# Altium footprint library SMD_Bauteile.PcbLib: 355 footprints (part 17 of 23)
Each footprint in its own frame and in the unit in brackets; x right, y up, seen from the top. Pads: shape width x height; smd on the part's side, far side on the other; paste and mask are expansions set on the pad; w line width, h text height; cw(c..) or ccw(c..) is an arc to the next point about the centre after c.
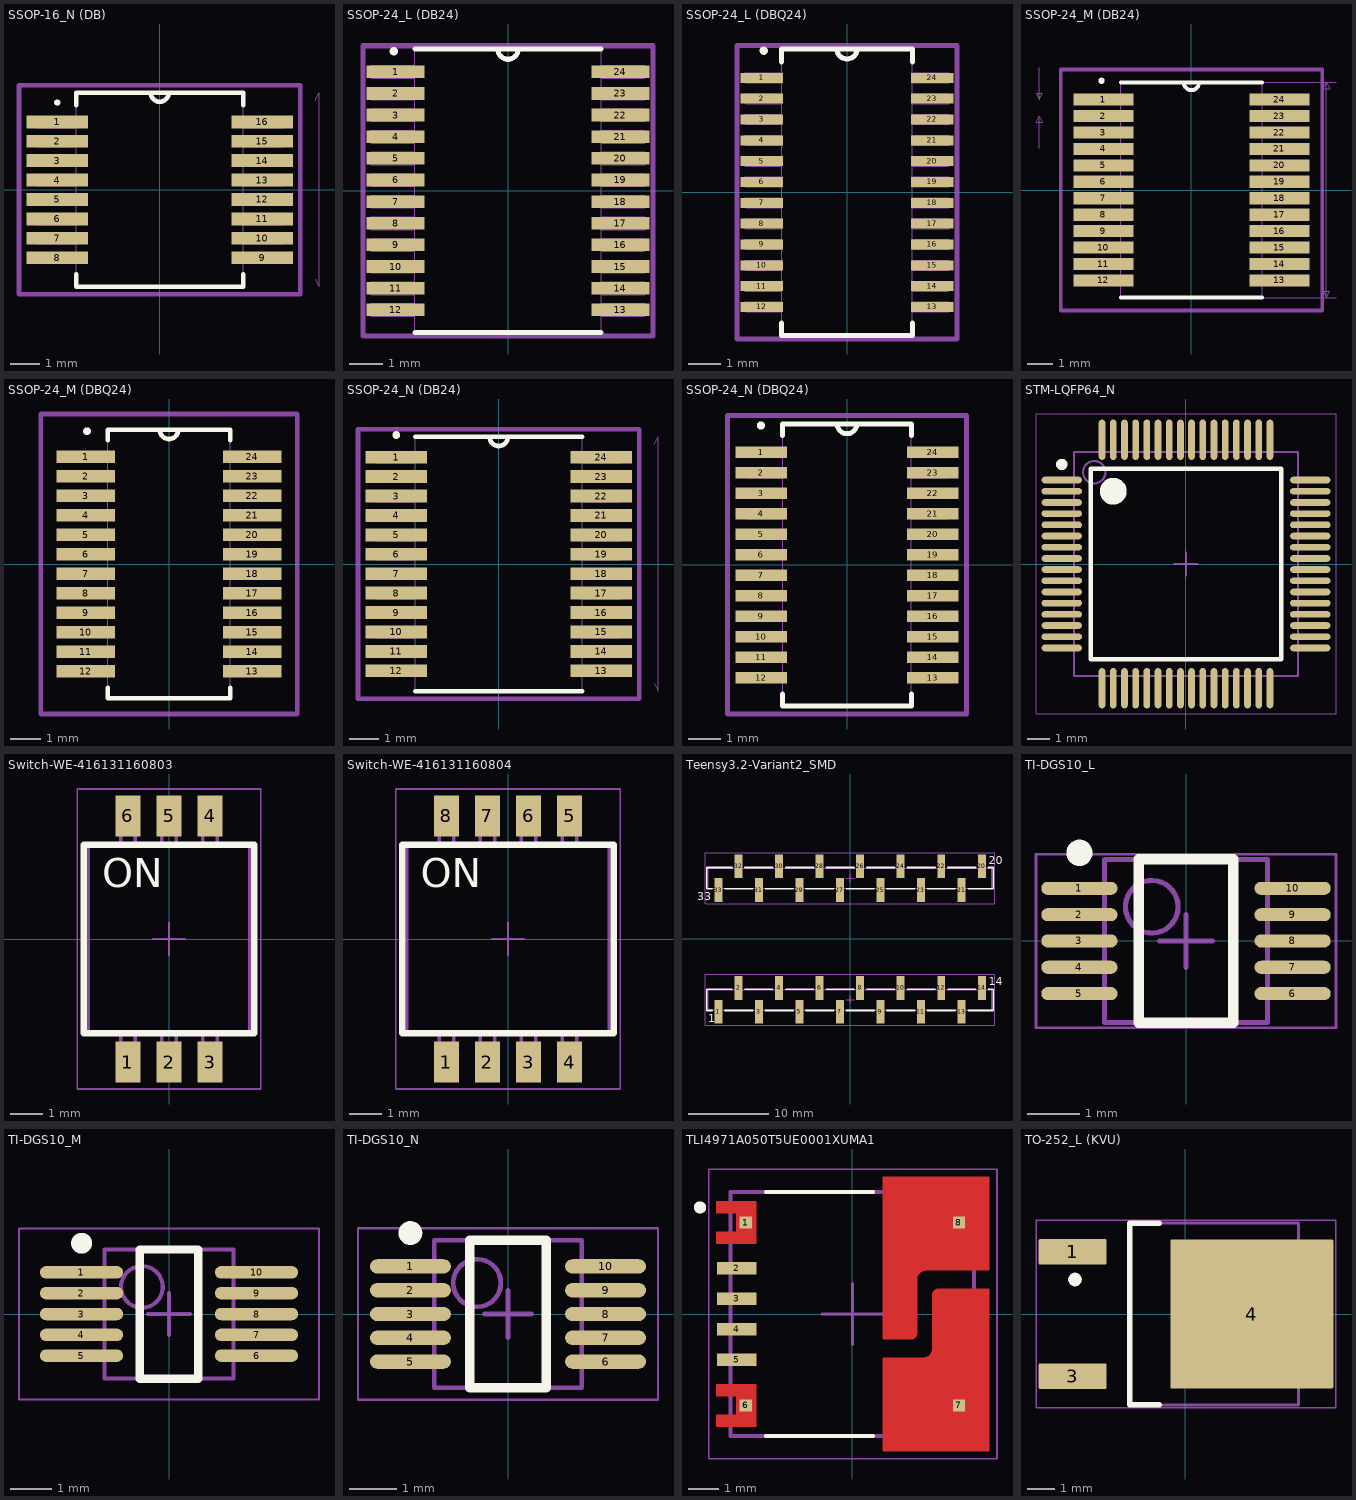
[diagram p16: the footprints below, top view; thin cyan lines are the x and y axes]

## SSOP-16_N (DB) [mil]
height 78.74
pads (16):
  rect 81x17 smd: 1(-135,89.57) 2(-135,63.98) 3(-135,38.39) 4(-135,12.8) 5(-135,-12.8) 6(-135,-38.39) 7(-135,-63.98) 8(-135,-89.57) 9(135,-89.57) 10(135,-63.98) 11(135,-38.39) 12(135,-12.8) 13(135,12.8) 14(135,38.39) 15(135,63.98) 16(135,89.57)
Top Overlay:
  circle w7.87: c-135.1,115 r0.1
  lines w6: -110,-111.17 -110,-128 110,-128 110,-111.17 ; -110,111.17 -110,128 110,128 110,111.17 ; -12,128 ccw(c0,128) 12,128
Top Courtyard:
  lines w1: 205,-118 210,-128 210,128 205,118
Mech Misc 1:
  lines w0: -12,128 ccw(c0,128) 12,128
  lines w1: -161.5,-97.07 -161.5,-82.07 -110,-82.07 -110,-97.07 -161.5,-97.07 ; -161.5,-71.48 -161.5,-56.48 -110,-56.48 -110,-71.48 -161.5,-71.48 ; -161.5,-45.89 -161.5,-30.89 -110,-30.89 -110,-45.89 -161.5,-45.89 ; -161.5,-20.3 -161.5,-5.3 -110,-5.3 -110,-20.3 -161.5,-20.3 ; -161.5,5.3 -161.5,20.3 -110,20.3 -110,5.3 -161.5,5.3 ; -161.5,30.89 -161.5,45.89 -110,45.89 -110,30.89 -161.5,30.89 ; -161.5,56.48 -161.5,71.48 -110,71.48 -110,56.48 -161.5,56.48 ; -161.5,82.07 -161.5,97.07 -110,97.07 -110,82.07 -161.5,82.07 ; -110,-128 110,-128 110,128 -110,128 -110,-128 ; 110,-97.07 110,-82.07 161.5,-82.07 161.5,-97.07 110,-97.07 ; 110,-71.48 110,-56.48 161.5,-56.48 161.5,-71.48 110,-71.48 ; 110,-45.89 110,-30.89 161.5,-30.89 161.5,-45.89 110,-45.89 ; 110,-20.3 110,-5.3 161.5,-5.3 161.5,-20.3 110,-20.3 ; 110,5.3 110,20.3 161.5,20.3 161.5,5.3 110,5.3 ; 110,30.89 110,45.89 161.5,45.89 161.5,30.89 110,30.89 ; 110,56.48 110,71.48 161.5,71.48 161.5,56.48 110,56.48 ; 110,82.07 110,97.07 161.5,97.07 161.5,82.07 110,82.07
Mech 15:
  lines w6: -185.5,-138 -185.5,138 185.5,138 185.5,-138 -185.5,-138
3D body "SSOP-16 (DB).stp": height 74.8, standoff 0, extent -153.54,-122.04 153.55,122.05

## SSOP-24_L (DB24) [mil]
height 78.74
pads (24):
  rect 69x15 smd: 1(-133,140.75) 2(-133,115.16) 3(-133,89.57) 4(-133,63.98) 5(-133,38.39) 6(-133,12.8) 7(-133,-12.8) 8(-133,-38.39) 9(-133,-63.98) 10(-133,-89.57) 11(-133,-115.16) 12(-133,-140.75) 13(133,-140.75) 14(133,-115.16) 15(133,-89.57) 16(133,-63.98) 17(133,-38.39) 18(133,-12.8) 19(133,12.8) 20(133,38.39) 21(133,63.98) 22(133,89.57) 23(133,115.16) 24(133,140.75)
Top Overlay:
  circle w10: c-135,165 r0.01
  lines w6: -110,-167.5 110,-167.5 ; -110,167.5 110,167.5 ; -12,167.5 ccw(c0,167.5) 12,167.5
Mech Misc 1:
  lines w0: -12,167.5 ccw(c0,167.5) 12,167.5
  lines w1: -161.5,-148.25 -161.5,-133.25 -110,-133.25 -110,-148.25 -161.5,-148.25 ; -161.5,-122.66 -161.5,-107.66 -110,-107.66 -110,-122.66 -161.5,-122.66 ; -161.5,-97.07 -161.5,-82.07 -110,-82.07 -110,-97.07 -161.5,-97.07 ; -161.5,-71.48 -161.5,-56.48 -110,-56.48 -110,-71.48 -161.5,-71.48 ; -161.5,-45.89 -161.5,-30.89 -110,-30.89 -110,-45.89 -161.5,-45.89 ; -161.5,-20.3 -161.5,-5.3 -110,-5.3 -110,-20.3 -161.5,-20.3 ; -161.5,5.3 -161.5,20.3 -110,20.3 -110,5.3 -161.5,5.3 ; -161.5,30.89 -161.5,45.89 -110,45.89 -110,30.89 -161.5,30.89 ; -161.5,56.48 -161.5,71.48 -110,71.48 -110,56.48 -161.5,56.48 ; -161.5,82.07 -161.5,97.07 -110,97.07 -110,82.07 -161.5,82.07 ; -161.5,107.66 -161.5,122.66 -110,122.66 -110,107.66 -161.5,107.66 ; -161.5,133.25 -161.5,148.25 -110,148.25 -110,133.25 -161.5,133.25 ; -110,-167.5 110,-167.5 110,167.5 -110,167.5 -110,-167.5 ; 110,-148.25 110,-133.25 161.5,-133.25 161.5,-148.25 110,-148.25 ; 110,-122.66 110,-107.66 161.5,-107.66 161.5,-122.66 110,-122.66 ; 110,-97.07 110,-82.07 161.5,-82.07 161.5,-97.07 110,-97.07 ; 110,-71.48 110,-56.48 161.5,-56.48 161.5,-71.48 110,-71.48 ; 110,-45.89 110,-30.89 161.5,-30.89 161.5,-45.89 110,-45.89 ; 110,-20.3 110,-5.3 161.5,-5.3 161.5,-20.3 110,-20.3 ; 110,5.3 110,20.3 161.5,20.3 161.5,5.3 110,5.3 ; 110,30.89 110,45.89 161.5,45.89 161.5,30.89 110,30.89 ; 110,56.48 110,71.48 161.5,71.48 161.5,56.48 110,56.48 ; 110,82.07 110,97.07 161.5,97.07 161.5,82.07 110,82.07 ; 110,107.66 110,122.66 161.5,122.66 161.5,107.66 110,107.66 ; 110,133.25 110,148.25 161.5,148.25 161.5,133.25 110,133.25
Mech 15:
  lines w6: -171.5,-171.5 -171.5,171.5 171.5,171.5 171.5,-171.5 -171.5,-171.5
3D body "SSOP-24-DB.stp": height 71.31, standoff -1.91, extent -154.06,-161.41 154.06,161.42
3D body: height 10, standoff 0, extent 0,0 10,10

## SSOP-24_L (DBQ24) [mil]
height 1.75
pads (24):
  rect 51x12 smd: 1(-102.5,137.5) 2(-102.5,112.5) 3(-102.5,87.5) 4(-102.5,62.5) 5(-102.5,37.5) 6(-102.5,12.5) 7(-102.5,-12.5) 8(-102.5,-37.5) 9(-102.5,-62.5) 10(-102.5,-87.5) 11(-102.5,-112.5) 12(-102.5,-137.5) 13(102.5,-137.5) 14(102.5,-112.5) 15(102.5,-87.5) 16(102.5,-62.5) 17(102.5,-37.5) 18(102.5,-12.5) 19(102.5,12.5) 20(102.5,37.5) 21(102.5,62.5) 22(102.5,87.5) 23(102.5,112.5) 24(102.5,137.5)
Top Overlay:
  circle w10: c-100.01,170 r0.01
  lines w6: -78.5,-156.6 -78.5,-172 78.5,-172 78.5,-156.6 ; -78.5,156.6 -78.5,172 78.5,172 78.5,156.6 ; -12,172 ccw(c0,172) 12,172
Mech Misc 1:
  lines w0: -12,172 ccw(c0,172) 12,172
  lines w1: -122,-143.5 -122,-131.5 -78.5,-131.5 -78.5,-143.5 -122,-143.5 ; -122,-118.5 -122,-106.5 -78.5,-106.5 -78.5,-118.5 -122,-118.5 ; -122,-93.5 -122,-81.5 -78.5,-81.5 -78.5,-93.5 -122,-93.5 ; -122,-68.5 -122,-56.5 -78.5,-56.5 -78.5,-68.5 -122,-68.5 ; -122,-43.5 -122,-31.5 -78.5,-31.5 -78.5,-43.5 -122,-43.5 ; -122,-18.5 -122,-6.5 -78.5,-6.5 -78.5,-18.5 -122,-18.5 ; -122,6.5 -122,18.5 -78.5,18.5 -78.5,6.5 -122,6.5 ; -122,31.5 -122,43.5 -78.5,43.5 -78.5,31.5 -122,31.5 ; -122,56.5 -122,68.5 -78.5,68.5 -78.5,56.5 -122,56.5 ; -122,81.5 -122,93.5 -78.5,93.5 -78.5,81.5 -122,81.5 ; -122,106.5 -122,118.5 -78.5,118.5 -78.5,106.5 -122,106.5 ; -122,131.5 -122,143.5 -78.5,143.5 -78.5,131.5 -122,131.5 ; -78.5,-172 78.5,-172 78.5,172 -78.5,172 -78.5,-172 ; 78.5,-143.5 78.5,-131.5 122,-131.5 122,-143.5 78.5,-143.5 ; 78.5,-118.5 78.5,-106.5 122,-106.5 122,-118.5 78.5,-118.5 ; 78.5,-93.5 78.5,-81.5 122,-81.5 122,-93.5 78.5,-93.5 ; 78.5,-68.5 78.5,-56.5 122,-56.5 122,-68.5 78.5,-68.5 ; 78.5,-43.5 78.5,-31.5 122,-31.5 122,-43.5 78.5,-43.5 ; 78.5,-18.5 78.5,-6.5 122,-6.5 122,-18.5 78.5,-18.5 ; 78.5,6.5 78.5,18.5 122,18.5 122,6.5 78.5,6.5 ; 78.5,31.5 78.5,43.5 122,43.5 122,31.5 78.5,31.5 ; 78.5,56.5 78.5,68.5 122,68.5 122,56.5 78.5,56.5 ; 78.5,81.5 78.5,93.5 122,93.5 122,81.5 78.5,81.5 ; 78.5,106.5 78.5,118.5 122,118.5 122,106.5 78.5,106.5 ; 78.5,131.5 78.5,143.5 122,143.5 122,131.5 78.5,131.5
Mech 15:
  lines w6: -132,-176 -132,176 132,176 132,-176 -132,-176
3D body: height 10, standoff 0, extent 0,0 10,10
3D body "SSOP-24-DBQ.stp": height 63, standoff 0, extent -117.99,-170.49 118.01,170.51

## SSOP-24_M (DB24) [mil]
height 78.74
pads (24):
  rect 93x19 smd: 1(-137,140.75) 2(-137,115.16) 3(-137,89.57) 4(-137,63.98) 5(-137,38.39) 6(-137,12.8) 7(-137,-12.8) 8(-137,-38.39) 9(-137,-63.98) 10(-137,-89.57) 11(-137,-115.16) 12(-137,-140.75) 13(137,-140.75) 14(137,-115.16) 15(137,-89.57) 16(137,-63.98) 17(137,-38.39) 18(137,-12.8) 19(137,12.8) 20(137,38.39) 21(137,63.98) 22(137,89.57) 23(137,115.16) 24(137,140.75)
Top Overlay:
  circle w10: c-140,170 r0.01
  lines w6: -110,-167.5 110,-167.5 ; -110,167.5 110,167.5 ; -12,167.5 ccw(c0,167.5) 12,167.5
Top Courtyard:
  lines w1: -237,65.16 -237,115.16 ; -237,190.75 -237,140.75 ; 0,-167.5 225,-167.5 ; 0,167.5 225,167.5 ; -237,115.16 -242,105.16 -232,105.16 -237,115.16 ; -237,140.75 -242,150.75 -232,150.75 -237,140.75 ; 210,-167.5 210,167.5 ; 210,-167.5 205,-157.5 215,-157.5 210,-167.5 ; 210,167.5 205,157.5 215,157.5 210,167.5
Mech Misc 1:
  lines w0: -12,167.5 ccw(c0,167.5) 12,167.5
  lines w1: -161.5,-148.25 -161.5,-133.25 -110,-133.25 -110,-148.25 -161.5,-148.25 ; -161.5,-122.66 -161.5,-107.66 -110,-107.66 -110,-122.66 -161.5,-122.66 ; -161.5,-97.07 -161.5,-82.07 -110,-82.07 -110,-97.07 -161.5,-97.07 ; -161.5,-71.48 -161.5,-56.48 -110,-56.48 -110,-71.48 -161.5,-71.48 ; -161.5,-45.89 -161.5,-30.89 -110,-30.89 -110,-45.89 -161.5,-45.89 ; -161.5,-20.3 -161.5,-5.3 -110,-5.3 -110,-20.3 -161.5,-20.3 ; -161.5,5.3 -161.5,20.3 -110,20.3 -110,5.3 -161.5,5.3 ; -161.5,30.89 -161.5,45.89 -110,45.89 -110,30.89 -161.5,30.89 ; -161.5,56.48 -161.5,71.48 -110,71.48 -110,56.48 -161.5,56.48 ; -161.5,82.07 -161.5,97.07 -110,97.07 -110,82.07 -161.5,82.07 ; -161.5,107.66 -161.5,122.66 -110,122.66 -110,107.66 -161.5,107.66 ; -161.5,133.25 -161.5,148.25 -110,148.25 -110,133.25 -161.5,133.25 ; -110,-167.5 110,-167.5 110,167.5 -110,167.5 -110,-167.5 ; 110,-148.25 110,-133.25 161.5,-133.25 161.5,-148.25 110,-148.25 ; 110,-122.66 110,-107.66 161.5,-107.66 161.5,-122.66 110,-122.66 ; 110,-97.07 110,-82.07 161.5,-82.07 161.5,-97.07 110,-97.07 ; 110,-71.48 110,-56.48 161.5,-56.48 161.5,-71.48 110,-71.48 ; 110,-45.89 110,-30.89 161.5,-30.89 161.5,-45.89 110,-45.89 ; 110,-20.3 110,-5.3 161.5,-5.3 161.5,-20.3 110,-20.3 ; 110,5.3 110,20.3 161.5,20.3 161.5,5.3 110,5.3 ; 110,30.89 110,45.89 161.5,45.89 161.5,30.89 110,30.89 ; 110,56.48 110,71.48 161.5,71.48 161.5,56.48 110,56.48 ; 110,82.07 110,97.07 161.5,97.07 161.5,82.07 110,82.07 ; 110,107.66 110,122.66 161.5,122.66 161.5,107.66 110,107.66 ; 110,133.25 110,148.25 161.5,148.25 161.5,133.25 110,133.25
Mech 15:
  lines w6: -203.5,-187.5 -203.5,187.5 203.5,187.5 203.5,-187.5 -203.5,-187.5
3D body "SSOP-24-DB.stp": height 71.31, standoff -1.91, extent -154.07,-161.41 154.06,161.42
3D body: height 10, standoff 0, extent 0,0 10,10

## SSOP-24_M (DBQ24) [mil]
height 1.75
pads (24):
  rect 75x16 smd: 1(-106.5,137.5) 2(-106.5,112.5) 3(-106.5,87.5) 4(-106.5,62.5) 5(-106.5,37.5) 6(-106.5,12.5) 7(-106.5,-12.5) 8(-106.5,-37.5) 9(-106.5,-62.5) 10(-106.5,-87.5) 11(-106.5,-112.5) 12(-106.5,-137.5) 13(106.5,-137.5) 14(106.5,-112.5) 15(106.5,-87.5) 16(106.5,-62.5) 17(106.5,-37.5) 18(106.5,-12.5) 19(106.5,12.5) 20(106.5,37.5) 21(106.5,62.5) 22(106.5,87.5) 23(106.5,112.5) 24(106.5,137.5)
Top Overlay:
  circle w10: c-105,170 r0.01
  lines w6: -78.5,-158.6 -78.5,-172 78.5,-172 78.5,-158.6 ; -78.5,158.6 -78.5,172 78.5,172 78.5,158.6 ; -12,172 ccw(c0,172) 12,172
Mech Misc 1:
  lines w0: -12,172 ccw(c0,172) 12,172
  lines w1: -122,-143.5 -122,-131.5 -78.5,-131.5 -78.5,-143.5 -122,-143.5 ; -122,-118.5 -122,-106.5 -78.5,-106.5 -78.5,-118.5 -122,-118.5 ; -122,-93.5 -122,-81.5 -78.5,-81.5 -78.5,-93.5 -122,-93.5 ; -122,-68.5 -122,-56.5 -78.5,-56.5 -78.5,-68.5 -122,-68.5 ; -122,-43.5 -122,-31.5 -78.5,-31.5 -78.5,-43.5 -122,-43.5 ; -122,-18.5 -122,-6.5 -78.5,-6.5 -78.5,-18.5 -122,-18.5 ; -122,6.5 -122,18.5 -78.5,18.5 -78.5,6.5 -122,6.5 ; -122,31.5 -122,43.5 -78.5,43.5 -78.5,31.5 -122,31.5 ; -122,56.5 -122,68.5 -78.5,68.5 -78.5,56.5 -122,56.5 ; -122,81.5 -122,93.5 -78.5,93.5 -78.5,81.5 -122,81.5 ; -122,106.5 -122,118.5 -78.5,118.5 -78.5,106.5 -122,106.5 ; -122,131.5 -122,143.5 -78.5,143.5 -78.5,131.5 -122,131.5 ; -78.5,-172 78.5,-172 78.5,172 -78.5,172 -78.5,-172 ; 78.5,-143.5 78.5,-131.5 122,-131.5 122,-143.5 78.5,-143.5 ; 78.5,-118.5 78.5,-106.5 122,-106.5 122,-118.5 78.5,-118.5 ; 78.5,-93.5 78.5,-81.5 122,-81.5 122,-93.5 78.5,-93.5 ; 78.5,-68.5 78.5,-56.5 122,-56.5 122,-68.5 78.5,-68.5 ; 78.5,-43.5 78.5,-31.5 122,-31.5 122,-43.5 78.5,-43.5 ; 78.5,-18.5 78.5,-6.5 122,-6.5 122,-18.5 78.5,-18.5 ; 78.5,6.5 78.5,18.5 122,18.5 122,6.5 78.5,6.5 ; 78.5,31.5 78.5,43.5 122,43.5 122,31.5 78.5,31.5 ; 78.5,56.5 78.5,68.5 122,68.5 122,56.5 78.5,56.5 ; 78.5,81.5 78.5,93.5 122,93.5 122,81.5 78.5,81.5 ; 78.5,106.5 78.5,118.5 122,118.5 122,106.5 78.5,106.5 ; 78.5,131.5 78.5,143.5 122,143.5 122,131.5 78.5,131.5
Mech 15:
  lines w6: -164,-192 -164,192 164,192 164,-192 -164,-192
3D body: height 10, standoff 0, extent 0,0 10,10
3D body "SSOP-24-DBQ.stp": height 63, standoff 0, extent -117.99,-170.49 118.01,170.51

## SSOP-24_N (DB24) [mil]
height 78.74
pads (24):
  rect 81x17 smd: 1(-135,140.75) 2(-135,115.16) 3(-135,89.57) 4(-135,63.98) 5(-135,38.39) 6(-135,12.8) 7(-135,-12.8) 8(-135,-38.39) 9(-135,-63.98) 10(-135,-89.57) 11(-135,-115.16) 12(-135,-140.75) 13(135,-140.75) 14(135,-115.16) 15(135,-89.57) 16(135,-63.98) 17(135,-38.39) 18(135,-12.8) 19(135,12.8) 20(135,38.39) 21(135,63.98) 22(135,89.57) 23(135,115.16) 24(135,140.75)
Top Overlay:
  circle w10: c-135,170 r0.01
  lines w6: -110,-167.5 110,-167.5 ; -110,167.5 110,167.5 ; -12,167.5 ccw(c0,167.5) 12,167.5
Top Courtyard:
  lines w1: 205,-157.5 210,-167.5 210,167.5 205,157.5
Mech Misc 1:
  lines w0: -12,167.5 ccw(c0,167.5) 12,167.5
  lines w1: -161.5,-148.25 -161.5,-133.25 -110,-133.25 -110,-148.25 -161.5,-148.25 ; -161.5,-122.66 -161.5,-107.66 -110,-107.66 -110,-122.66 -161.5,-122.66 ; -161.5,-97.07 -161.5,-82.07 -110,-82.07 -110,-97.07 -161.5,-97.07 ; -161.5,-71.48 -161.5,-56.48 -110,-56.48 -110,-71.48 -161.5,-71.48 ; -161.5,-45.89 -161.5,-30.89 -110,-30.89 -110,-45.89 -161.5,-45.89 ; -161.5,-20.3 -161.5,-5.3 -110,-5.3 -110,-20.3 -161.5,-20.3 ; -161.5,5.3 -161.5,20.3 -110,20.3 -110,5.3 -161.5,5.3 ; -161.5,30.89 -161.5,45.89 -110,45.89 -110,30.89 -161.5,30.89 ; -161.5,56.48 -161.5,71.48 -110,71.48 -110,56.48 -161.5,56.48 ; -161.5,82.07 -161.5,97.07 -110,97.07 -110,82.07 -161.5,82.07 ; -161.5,107.66 -161.5,122.66 -110,122.66 -110,107.66 -161.5,107.66 ; -161.5,133.25 -161.5,148.25 -110,148.25 -110,133.25 -161.5,133.25 ; -110,-167.5 110,-167.5 110,167.5 -110,167.5 -110,-167.5 ; 110,-148.25 110,-133.25 161.5,-133.25 161.5,-148.25 110,-148.25 ; 110,-122.66 110,-107.66 161.5,-107.66 161.5,-122.66 110,-122.66 ; 110,-97.07 110,-82.07 161.5,-82.07 161.5,-97.07 110,-97.07 ; 110,-71.48 110,-56.48 161.5,-56.48 161.5,-71.48 110,-71.48 ; 110,-45.89 110,-30.89 161.5,-30.89 161.5,-45.89 110,-45.89 ; 110,-20.3 110,-5.3 161.5,-5.3 161.5,-20.3 110,-20.3 ; 110,5.3 110,20.3 161.5,20.3 161.5,5.3 110,5.3 ; 110,30.89 110,45.89 161.5,45.89 161.5,30.89 110,30.89 ; 110,56.48 110,71.48 161.5,71.48 161.5,56.48 110,56.48 ; 110,82.07 110,97.07 161.5,97.07 161.5,82.07 110,82.07 ; 110,107.66 110,122.66 161.5,122.66 161.5,107.66 110,107.66 ; 110,133.25 110,148.25 161.5,148.25 161.5,133.25 110,133.25
Mech 15:
  lines w6: -185.5,-177.5 -185.5,177.5 185.5,177.5 185.5,-177.5 -185.5,-177.5
3D body "SSOP-24-DB.stp": height 71.31, standoff -1.91, extent -154.06,-161.41 154.07,161.42
3D body: height 10, standoff 0, extent 0,0 10,10

## SSOP-24_N (DBQ24) [mil]
height 1.75
pads (24):
  rect 63x14 smd: 1(-104.5,137.5) 2(-104.5,112.5) 3(-104.5,87.5) 4(-104.5,62.5) 5(-104.5,37.5) 6(-104.5,12.5) 7(-104.5,-12.5) 8(-104.5,-37.5) 9(-104.5,-62.5) 10(-104.5,-87.5) 11(-104.5,-112.5) 12(-104.5,-137.5) 13(104.5,-137.5) 14(104.5,-112.5) 15(104.5,-87.5) 16(104.5,-62.5) 17(104.5,-37.5) 18(104.5,-12.5) 19(104.5,12.5) 20(104.5,37.5) 21(104.5,62.5) 22(104.5,87.5) 23(104.5,112.5) 24(104.5,137.5)
Top Overlay:
  circle w10: c-105.01,170 r0.01
  lines w6: -78.5,-157.6 -78.5,-172 78.5,-172 78.5,-157.6 ; -78.5,157.6 -78.5,172 78.5,172 78.5,157.6 ; -12,172 ccw(c0,172) 12,172
Mech Misc 1:
  lines w0: -12,172 ccw(c0,172) 12,172
  lines w1: -122,-143.5 -78.5,-143.5 -78.5,-131.5 -122,-131.5 -122,-143.5 ; -122,-118.5 -78.5,-118.5 -78.5,-106.5 -122,-106.5 -122,-118.5 ; -122,-93.5 -78.5,-93.5 -78.5,-81.5 -122,-81.5 -122,-93.5 ; -122,-68.5 -78.5,-68.5 -78.5,-56.5 -122,-56.5 -122,-68.5 ; -122,-43.5 -78.5,-43.5 -78.5,-31.5 -122,-31.5 -122,-43.5 ; -122,-18.5 -78.5,-18.5 -78.5,-6.5 -122,-6.5 -122,-18.5 ; -122,6.5 -78.5,6.5 -78.5,18.5 -122,18.5 -122,6.5 ; -122,31.5 -78.5,31.5 -78.5,43.5 -122,43.5 -122,31.5 ; -122,56.5 -78.5,56.5 -78.5,68.5 -122,68.5 -122,56.5 ; -122,81.5 -78.5,81.5 -78.5,93.5 -122,93.5 -122,81.5 ; -122,106.5 -78.5,106.5 -78.5,118.5 -122,118.5 -122,106.5 ; -122,131.5 -78.5,131.5 -78.5,143.5 -122,143.5 -122,131.5 ; -78.5,-172 -78.5,172 78.5,172 78.5,-172 -78.5,-172 ; 78.5,-143.5 122,-143.5 122,-131.5 78.5,-131.5 78.5,-143.5 ; 78.5,-118.5 122,-118.5 122,-106.5 78.5,-106.5 78.5,-118.5 ; 78.5,-93.5 122,-93.5 122,-81.5 78.5,-81.5 78.5,-93.5 ; 78.5,-68.5 122,-68.5 122,-56.5 78.5,-56.5 78.5,-68.5 ; 78.5,-43.5 122,-43.5 122,-31.5 78.5,-31.5 78.5,-43.5 ; 78.5,-18.5 122,-18.5 122,-6.5 78.5,-6.5 78.5,-18.5 ; 78.5,6.5 122,6.5 122,18.5 78.5,18.5 78.5,6.5 ; 78.5,31.5 122,31.5 122,43.5 78.5,43.5 78.5,31.5 ; 78.5,56.5 122,56.5 122,68.5 78.5,68.5 78.5,56.5 ; 78.5,81.5 122,81.5 122,93.5 78.5,93.5 78.5,81.5 ; 78.5,106.5 122,106.5 122,118.5 78.5,118.5 78.5,106.5 ; 78.5,131.5 122,131.5 122,143.5 78.5,143.5 78.5,131.5
Mech 15:
  lines w6: -146,-182 146,-182 146,182 -146,182 -146,-182
3D body: height 10, standoff 0, extent 0,0 10,10
3D body "SSOP-24-DBQ.stp": height 63, standoff 0, extent -117.99,-170.49 118.01,170.51

## STM-LQFP64_N [mm] "Thin QFP, 64-Leads, Body 10x10mm, Pitch 0.5mm, IPC Medium Density"
height 1.6
pads (64):
  oval 1.8x0.3 smd: 1(-5.55,3.75) 2(-5.55,3.25) 3(-5.55,2.75) 4(-5.55,2.25) 5(-5.55,1.75) 6(-5.55,1.25) 7(-5.55,0.75) 8(-5.55,0.25) 9(-5.55,-0.25) 10(-5.55,-0.75) 11(-5.55,-1.25) 12(-5.55,-1.75) 13(-5.55,-2.25) 14(-5.55,-2.75) 15(-5.55,-3.25) 16(-5.55,-3.75) 33(5.55,-3.75) 34(5.55,-3.25) 35(5.55,-2.75) 36(5.55,-2.25) 37(5.55,-1.75) 38(5.55,-1.25) 39(5.55,-0.75) 40(5.55,-0.25) 41(5.55,0.25) 42(5.55,0.75) 43(5.55,1.25) 44(5.55,1.75) 45(5.55,2.25) 46(5.55,2.75) 47(5.55,3.25) 48(5.55,3.75)
  oval 0.3x1.8 smd: 17(-3.75,-5.55) 18(-3.25,-5.55) 19(-2.75,-5.55) 20(-2.25,-5.55) 21(-1.75,-5.55) 22(-1.25,-5.55) 23(-0.75,-5.55) 24(-0.25,-5.55) 25(0.25,-5.55) 26(0.75,-5.55) 27(1.25,-5.55) 28(1.75,-5.55) 29(2.25,-5.55) 30(2.75,-5.55) 31(3.25,-5.55) 32(3.75,-5.55) 49(3.75,5.55) 50(3.25,5.55) 51(2.75,5.55) 52(2.25,5.55) 53(1.75,5.55) 54(1.25,5.55) 55(0.75,5.55) 56(0.25,5.55) 57(-0.25,5.55) 58(-0.75,5.55) 59(-1.25,5.55) 60(-1.75,5.55) 61(-2.25,5.55) 62(-2.75,5.55) 63(-3.25,5.55) 64(-3.75,5.55)
Top Overlay:
  circle w0.6: c-3.25,3.25 r0.3
  circle w0.25: c-5.55,4.45 r0.125
  lines w0.2: -4.25,-4.25 4.25,-4.25 4.25,4.25 -4.25,4.25 -4.25,-4.25
Mech Misc 1:
  circle w0.1: c-4.1,4.1 r0.5
  lines w0.1: -5,-5 5,-5 5,5 -5,5 -5,-5
Mech 15:
  lines w0.05: -6.7,-6.7 6.7,-6.7 6.7,6.7 -6.7,6.7 -6.7,-6.7
  lines w0.1: -0.5,0 0.5,0 ; 0,-0.5 0,0.5
3D body: height 1.6, standoff 0.05, extent -5,-5 5,5

## Switch-WE-416131160803 [mm] "SMD Dip Switch, Small Compact, Raised Actuator, 3pin"
height 2.65
pads (6):
  rect 0.76x1.27 smd: 1(-1.27,-3.81) 2(0,-3.81) 3(1.27,-3.81) 4(1.27,3.81) 5(0,3.81) 6(-1.27,3.81)
Top Overlay:
  lines w0.2: -2.64,-2.925 -2.64,2.925 2.64,2.925 2.64,-2.925 -2.64,-2.925
  text "ON" at -2.07,1.6 h0.89
Mech Misc 1:
  lines w0.1: -1.495,-2.9 -1.495,-4.32 -1.045,-4.32 -1.045,-2.9 ; -1.495,2.9 -1.495,4.32 -1.045,4.32 -1.045,2.9 ; -0.225,-2.9 -0.225,-4.32 0.225,-4.32 0.225,-2.9 ; -0.225,2.9 -0.225,4.32 0.225,4.32 0.225,2.9 ; 1.045,-2.9 1.045,-4.32 1.495,-4.32 1.495,-2.9 ; 1.045,2.9 1.045,4.32 1.495,4.32 1.495,2.9 ; -2.49,-2.9 2.49,-2.9 2.49,2.9 -2.49,2.9 -2.49,-2.9
  text "ON" at -2.07,1.6 h0.89
Mech 15:
  lines w0.05: -0.5,0 0.5,0 ; 0,-0.5 0,0.5 ; -2.84,-4.645 -2.84,4.645 2.84,4.645 2.84,-4.645 -2.84,-4.645
3D body "416131160803.stp": height 2.65, standoff 0, extent -2.49,-4.22 2.49,4.22

## Switch-WE-416131160804 [mm] "SMD Dip Switch, Small Compact, Raised Actuator, 4pin"
height 2.65
pads (8):
  rect 0.76x1.27 smd: 1(-1.905,-3.81) 2(-0.635,-3.81) 3(0.635,-3.81) 4(1.905,-3.81) 5(1.905,3.81) 6(0.635,3.81) 7(-0.635,3.81) 8(-1.905,3.81)
Top Overlay:
  lines w0.2: -3.275,-2.925 -3.275,2.925 3.275,2.925 3.275,-2.925 -3.275,-2.925
  text "ON" at -2.705,1.6 h0.89
Mech Misc 1:
  lines w0.1: -2.13,-2.9 -2.13,-4.32 -1.68,-4.32 -1.68,-2.9 ; -2.13,2.9 -2.13,4.32 -1.68,4.32 -1.68,2.9 ; -0.86,-2.9 -0.86,-4.32 -0.41,-4.32 -0.41,-2.9 ; -0.86,2.9 -0.86,4.32 -0.41,4.32 -0.41,2.9 ; 0.41,-2.9 0.41,-4.32 0.86,-4.32 0.86,-2.9 ; 0.41,2.9 0.41,4.32 0.86,4.32 0.86,2.9 ; 1.68,-2.9 1.68,-4.32 2.13,-4.32 2.13,-2.9 ; 1.68,2.9 1.68,4.32 2.13,4.32 2.13,2.9 ; -3.125,-2.9 3.125,-2.9 3.125,2.9 -3.125,2.9 -3.125,-2.9
  text "ON" at -2.705,1.6 h0.89
Mech 15:
  lines w0.05: -0.5,0 0.5,0 ; 0,-0.5 0,0.5 ; -3.475,-4.645 -3.475,4.645 3.475,4.645 3.475,-4.645 -3.475,-4.645
3D body "416131160804.stp": height 2.7, standoff 0, extent -3.125,-4.22 3.125,4.22

## Teensy3.2-Variant2_SMD [mm]
pads (28):
  rect 1x3 smd: 1(-16.51,-9.12) 2(-13.97,-6.12) 3(-11.43,-9.12) 4(-8.89,-6.12) 5(-6.35,-9.12) 6(-3.81,-6.12) 7(-1.27,-9.12) 8(1.27,-6.12) 9(3.81,-9.12) 10(6.35,-6.12) 11(8.89,-9.12) 12(11.43,-6.12) 13(13.97,-9.12) 14(16.51,-6.12) 20(16.51,9.12) 21(13.97,6.12) 22(11.43,9.12) 23(8.89,6.12) 24(6.35,9.12) 25(3.81,6.12) 26(1.27,9.12) 27(-1.27,6.12) 28(-3.81,9.12) 29(-6.35,6.12) 30(-8.89,9.12) 31(-11.43,6.12) 32(-13.97,9.12) 33(-16.51,6.12)
Top Overlay:
  lines w0.2: -17.3,-8.965 -17.93,-8.965 -17.93,-6.275 -14.75,-6.275 ; -17.3,6.275 -17.93,6.275 -17.93,8.965 -14.75,8.965 ; -15.7,-8.965 -12.2,-8.965 ; -15.7,6.275 -12.2,6.275 ; -13.16,-6.275 -9.66,-6.275 ; -13.16,8.965 -9.66,8.965 ; -10.62,-8.965 -7.12,-8.965 ; -10.62,6.275 -7.12,6.275 ; -8.08,-6.275 -4.58,-6.275 ; -8.08,8.965 -4.58,8.965 ; -5.54,-8.965 -2.04,-8.965 ; -5.54,6.275 -2.04,6.275 ; -3,-6.275 0.5,-6.275 ; -3,8.965 0.5,8.965 ; -0.46,-8.965 3.04,-8.965 ; -0.46,6.275 3.04,6.275 ; 2.08,-6.275 5.58,-6.275 ; 2.08,8.965 5.58,8.965 ; 4.62,-8.965 8.12,-8.965 ; 4.62,6.275 8.12,6.275 ; 7.16,-6.275 10.66,-6.275 ; 7.16,8.965 10.66,8.965 ; 9.7,-8.965 13.2,-8.965 ; 9.7,6.275 13.2,6.275 ; 12.24,-6.275 15.74,-6.275 ; 12.24,8.965 15.74,8.965 ; 14.8,-8.965 17.93,-8.965 17.93,-6.275 17.3,-6.275 ; 14.8,6.275 17.93,6.275 17.93,8.965 17.3,8.965
  text "1" at -17.78,-10.414 h1.02
  text "33" at -19.177,4.826 h1.02
  text "20" at 17.399,9.398 h1.02
  text "14" at 17.4,-5.82 h1.02
Mech Misc 1:
  lines w0.1: -16.83,-8.89 -16.83,-10.12 -16.19,-10.12 -16.19,-8.89 ; -16.83,6.35 -16.83,5.12 -16.19,5.12 -16.19,6.35 ; -14.29,-6.35 -14.29,-5.12 -13.65,-5.12 -13.65,-6.35 ; -14.29,8.89 -14.29,10.12 -13.65,10.12 -13.65,8.89 ; -11.75,-8.89 -11.75,-10.12 -11.11,-10.12 -11.11,-8.89 ; -11.75,6.35 -11.75,5.12 -11.11,5.12 -11.11,6.35 ; -9.21,-6.35 -9.21,-5.12 -8.57,-5.12 -8.57,-6.35 ; -9.21,8.89 -9.21,10.12 -8.57,10.12 -8.57,8.89 ; -6.67,-8.89 -6.67,-10.12 -6.03,-10.12 -6.03,-8.89 ; -6.67,6.35 -6.67,5.12 -6.03,5.12 -6.03,6.35 ; -4.13,-6.35 -4.13,-5.12 -3.49,-5.12 -3.49,-6.35 ; -4.13,8.89 -4.13,10.12 -3.49,10.12 -3.49,8.89 ; -1.59,-8.89 -1.59,-10.12 -0.95,-10.12 -0.95,-8.89 ; -1.59,6.35 -1.59,5.12 -0.95,5.12 -0.95,6.35 ; 0.95,-6.35 0.95,-5.12 1.59,-5.12 1.59,-6.35 ; 0.95,8.89 0.95,10.12 1.59,10.12 1.59,8.89 ; 3.49,-8.89 3.49,-10.12 4.13,-10.12 4.13,-8.89 ; 3.49,6.35 3.49,5.12 4.13,5.12 4.13,6.35 ; 6.03,-6.35 6.03,-5.12 6.67,-5.12 6.67,-6.35 ; 6.03,8.89 6.03,10.12 6.67,10.12 6.67,8.89 ; 8.57,-8.89 8.57,-10.12 9.21,-10.12 9.21,-8.89 ; 8.57,6.35 8.57,5.12 9.21,5.12 9.21,6.35 ; 11.11,-6.35 11.11,-5.12 11.75,-5.12 11.75,-6.35 ; 11.11,8.89 11.11,10.12 11.75,10.12 11.75,8.89 ; 13.65,-8.89 13.65,-10.12 14.29,-10.12 14.29,-8.89 ; 13.65,6.35 13.65,5.12 14.29,5.12 14.29,6.35 ; 16.19,-6.35 16.19,-5.12 16.83,-5.12 16.83,-6.35 ; 16.19,8.89 16.19,10.12 16.83,10.12 16.83,8.89 ; -17.78,-8.89 -17.78,-6.35 17.78,-6.35 17.78,-8.89 -17.78,-8.89 ; -17.78,6.35 17.78,6.35 17.78,8.89 -17.78,8.89 -17.78,6.35
Mech 15:
  lines w0.05: -0.5,-7.62 0.5,-7.62 ; -0.5,7.62 0.5,7.62 ; 0,-8.12 0,-7.12 ; 0,7.12 0,8.12 ; -18.13,-10.82 -18.13,-4.42 18.13,-4.42 18.13,-10.82 -18.13,-10.82 ; -18.13,4.42 18.13,4.42 18.13,10.82 -18.13,10.82 -18.13,4.42
3D body "61001418221.stp": height 9.33, standoff 0, extent -17.78,5.12 17.78,10.12
3D body "61001418221.stp": height 9.33, standoff 0, extent -17.78,-10.12 17.78,-5.12

## TI-DGS10_L [mm] "SOP, 10-Leads, Body 3x3mm, Pitch 0.5mm, IPC High Density"
height 1.1
pads (10):
  oval 1.45x0.25 smd: 1(-2.025,1) 2(-2.025,0.5) 3(-2.025,0) 4(-2.025,-0.5) 5(-2.025,-1) 6(2.025,-1) 7(2.025,-0.5) 8(2.025,0) 9(2.025,0.5) 10(2.025,1)
Top Overlay:
  circle w0.25: c-2.025,1.675 r0.125
  lines w0.2: -0.9,-1.55 0.9,-1.55 0.9,1.55 -0.9,1.55 -0.9,-1.55
Mech Misc 1:
  circle w0.1: c-0.65,0.65 r0.5
  lines w0.1: -1.55,-1.55 1.55,-1.55 1.55,1.55 -1.55,1.55 -1.55,-1.55
Mech 15:
  lines w0.05: -2.85,-1.65 2.85,-1.65 2.85,1.65 -2.85,1.65 -2.85,-1.65
  lines w0.1: -0.5,0 0.5,0 ; 0,-0.5 0,0.5
3D body: height 1.1, standoff 0.05, extent -1.55,-1.55 1.55,1.55

## TI-DGS10_M [mm] "SOP, 10-Leads, Body 3x3mm, Pitch 0.5mm, IPC Low Density"
height 1.1
pads (10):
  oval 2x0.3 smd: 1(-2.1,1) 2(-2.1,0.5) 3(-2.1,0) 4(-2.1,-0.5) 5(-2.1,-1) 6(2.1,-1) 7(2.1,-0.5) 8(2.1,0) 9(2.1,0.5) 10(2.1,1)
Top Overlay:
  circle w0.25: c-2.1,1.7 r0.125
  lines w0.2: -0.7,-1.55 0.7,-1.55 0.7,1.55 -0.7,1.55 -0.7,-1.55
Mech Misc 1:
  circle w0.1: c-0.65,0.65 r0.5
  lines w0.1: -1.55,-1.55 1.55,-1.55 1.55,1.55 -1.55,1.55 -1.55,-1.55
Mech 15:
  lines w0.05: -3.6,-2.05 3.6,-2.05 3.6,2.05 -3.6,2.05 -3.6,-2.05
  lines w0.1: -0.5,0 0.5,0 ; 0,-0.5 0,0.5
3D body: height 1.1, standoff 0.05, extent -1.55,-1.55 1.55,1.55

## TI-DGS10_N [mm] "SOP, 10-Leads, Body 3x3mm, Pitch 0.5mm, IPC Medium Density"
height 1.1
pads (10):
  oval 1.7x0.3 smd: 1(-2.05,1) 2(-2.05,0.5) 3(-2.05,0) 4(-2.05,-0.5) 5(-2.05,-1) 6(2.05,-1) 7(2.05,-0.5) 8(2.05,0) 9(2.05,0.5) 10(2.05,1)
Top Overlay:
  circle w0.25: c-2.05,1.7 r0.125
  lines w0.2: -0.8,-1.55 0.8,-1.55 0.8,1.55 -0.8,1.55 -0.8,-1.55
Mech Misc 1:
  circle w0.1: c-0.65,0.65 r0.5
  lines w0.1: -1.55,-1.55 1.55,-1.55 1.55,1.55 -1.55,1.55 -1.55,-1.55
Mech 15:
  lines w0.05: -3.15,-1.8 3.15,-1.8 3.15,1.8 -3.15,1.8 -3.15,-1.8
  lines w0.1: -0.5,0 0.5,0 ; 0,-0.5 0,0.5
3D body: height 1.1, standoff 0.05, extent -1.55,-1.55 1.55,1.55

## TLI4971A050T5UE0001XUMA1 [mm]
pads (8):
  rect 0.4x0.4 smd paste+0.05 mask+0: 1(-3.5,3) 6(-3.5,-3)
  rect 1.3x0.4 smd paste-2: 2(-3.8,1.5) 3(-3.8,0.5) 4(-3.8,-0.5) 5(-3.8,-1.5)
  rect 0.4x0.4 smd paste-1 mask+0: 7(3.5,-3) 8(3.5,3)
Top Layer:
  region: 4.5,1.43 2.425,1.43 2.409,1.43 2.394,1.428 2.378,1.426 2.363,1.423 2.347,1.42 2.332,1.415 2.317,1.41 2.303,1.404 2.289,1.397 2.275,1.39 2.262,1.382 2.249,1.373 2.236,1.363 2.224,1.353 2.213,1.342 2.202,1.331 2.192,1.319 2.182,1.306 2.173,1.293 2.165,1.28 2.158,1.266 2.151,1.252 2.145,1.238 2.14,1.223 2.135,1.208 2.132,1.192 2.129,1.177 2.127,1.161 2.125,1.146 2.125,1.13 2.125,-0.63 2.125,-0.64 2.124,-0.651 2.123,-0.661 2.121,-0.672 2.118,-0.682 2.115,-0.692 2.112,-0.702 2.108,-0.711 2.103,-0.721 2.098,-0.73 2.093,-0.739 2.087,-0.748 2.08,-0.756 2.074,-0.764 2.066,-0.771 2.059,-0.779 2.051,-0.785 2.043,-0.792 2.034,-0.798 2.025,-0.803 2.016,-0.808 2.006,-0.813 1.997,-0.817 1.987,-0.82 1.977,-0.823 1.967,-0.826 1.956,-0.828 1.946,-0.829 1.935,-0.83 1.925,-0.83 1,-0.83 1,4.5 4.5,4.5
  region: 4.5,-4.5 1,-4.5 1,-1.43 2.325,-1.43 2.341,-1.43 2.356,-1.428 2.372,-1.426 2.387,-1.423 2.403,-1.42 2.418,-1.415 2.433,-1.41 2.447,-1.404 2.461,-1.397 2.475,-1.39 2.488,-1.382 2.501,-1.373 2.514,-1.363 2.526,-1.353 2.537,-1.342 2.548,-1.331 2.558,-1.319 2.568,-1.306 2.577,-1.293 2.585,-1.28 2.592,-1.266 2.599,-1.252 2.605,-1.238 2.61,-1.223 2.615,-1.208 2.618,-1.192 2.621,-1.177 2.623,-1.161 2.625,-1.146 2.625,-1.13 2.625,0.63 2.625,0.64 2.626,0.651 2.627,0.661 2.629,0.672 2.632,0.682 2.635,0.692 2.638,0.702 2.642,0.711 2.647,0.721 2.652,0.73 2.657,0.739 2.663,0.748 2.67,0.756 2.676,0.764 2.684,0.771 2.691,0.779 2.699,0.785 2.707,0.792 2.716,0.798 2.725,0.803 2.734,0.808 2.744,0.813 2.753,0.817 2.763,0.82 2.773,0.823 2.783,0.826 2.794,0.828 2.804,0.829 2.815,0.83 2.825,0.83 4.5,0.83
  region: -3.15,-3.7 -4.46,-3.7 -4.46,-3.3 -3.81,-3.3 -3.81,-2.7 -4.46,-2.7 -4.46,-2.3 -3.15,-2.3
  region: -3.15,2.3 -4.46,2.3 -4.46,2.7 -3.81,2.7 -3.81,3.3 -4.46,3.3 -4.46,3.7 -3.15,3.7
Top Overlay:
  circle w0.2: c-5,3.5 r0.1
  lines w0.127: -2.83,-4 0.68,-4 ; -2.83,4 0.68,4
Top Paste:
  region: 4.311,-4.25 3.911,-4.25 3.911,-1.63 4.311,-1.63
  region: 4.311,-1.43 3.911,-1.43 3.911,0.625 4.311,0.625
  region: 4.311,1.63 3.911,1.63 3.911,4.25 4.311,4.25
  region: 3.711,3.025 3.261,3.025 3.261,4.25 3.711,4.25
  region: 3.711,1.63 3.261,1.63 3.261,2.225 3.711,2.225
  region: 3.711,0.125 2.848,0.125 2.848,0.625 3.711,0.625
  region: 3.711,-2.175 2.848,-2.175 2.848,-0.675 3.711,-0.675
  region: 3.711,-4.25 2.848,-4.25 2.848,-2.975 3.711,-2.975
  region: 2.648,-4.25 2.111,-4.25 2.111,-1.63 2.648,-1.63
  region: 3.061,1.63 2.111,1.63 2.111,4.25 3.061,4.25
  region: 1.911,-4.25 1.211,-4.25 1.211,-2.975 1.911,-2.975
  region: 1.911,-2.175 1.211,-2.175 1.211,-1.63 1.911,-1.63
  region: 1.911,-0.63 1.211,-0.63 1.211,-0.175 1.911,-0.175
  region: 1.911,3.025 1.211,3.025 1.211,4.25 1.911,4.25
  region: 1.911,0.625 1.211,0.625 1.211,2.225 1.911,2.225
  region: -3.24,-3.65 -4.44,-3.65 -4.44,-3.35 -3.24,-3.35
  region: -3.24,-2.65 -4.44,-2.65 -4.44,-2.35 -3.24,-2.35
  region: -3.24,-1.65 -4.44,-1.65 -4.44,-1.35 -3.24,-1.35
  region: -3.24,-0.65 -4.44,-0.65 -4.44,-0.35 -3.24,-0.35
  region: -3.24,3.35 -4.44,3.35 -4.44,3.65 -3.24,3.65
  region: -3.24,2.35 -4.44,2.35 -4.44,2.65 -3.24,2.65
  region: -3.24,1.35 -4.44,1.35 -4.44,1.65 -3.24,1.65
  region: -3.24,0.35 -4.44,0.35 -4.44,0.65 -3.24,0.65
Top Solder:
  region: 4.6,1.33 2.425,1.33 2.415,1.33 2.404,1.329 2.394,1.328 2.383,1.326 2.373,1.323 2.363,1.32 2.353,1.317 2.344,1.313 2.334,1.308 2.325,1.303 2.316,1.298 2.307,1.292 2.299,1.285 2.291,1.279 2.284,1.271 2.276,1.264 2.27,1.256 2.263,1.248 2.257,1.239 2.252,1.23 2.247,1.221 2.242,1.211 2.238,1.202 2.235,1.192 2.232,1.182 2.229,1.172 2.227,1.161 2.226,1.151 2.225,1.14 2.225,1.13 2.225,-0.63 2.225,-0.646 2.223,-0.661 2.221,-0.677 2.218,-0.692 2.215,-0.708 2.21,-0.723 2.205,-0.738 2.199,-0.752 2.192,-0.766 2.185,-0.78 2.177,-0.793 2.168,-0.806 2.158,-0.819 2.148,-0.831 2.137,-0.842 2.126,-0.853 2.114,-0.863 2.101,-0.873 2.088,-0.882 2.075,-0.89 2.061,-0.897 2.047,-0.904 2.033,-0.91 2.018,-0.915 2.003,-0.92 1.987,-0.923 1.972,-0.926 1.956,-0.928 1.941,-0.93 1.925,-0.93 0.9,-0.93 0.9,4.6 4.6,4.6
  region: 4.6,-4.6 0.9,-4.6 0.9,-1.33 2.325,-1.33 2.335,-1.33 2.346,-1.329 2.356,-1.328 2.367,-1.326 2.377,-1.323 2.387,-1.32 2.397,-1.317 2.406,-1.313 2.416,-1.308 2.425,-1.303 2.434,-1.298 2.443,-1.292 2.451,-1.285 2.459,-1.279 2.466,-1.271 2.474,-1.264 2.48,-1.256 2.487,-1.248 2.493,-1.239 2.498,-1.23 2.503,-1.221 2.508,-1.211 2.512,-1.202 2.515,-1.192 2.518,-1.182 2.521,-1.172 2.523,-1.161 2.524,-1.151 2.525,-1.14 2.525,-1.13 2.525,0.63 2.525,0.646 2.527,0.661 2.529,0.677 2.532,0.692 2.535,0.708 2.54,0.723 2.545,0.738 2.551,0.752 2.558,0.766 2.565,0.78 2.573,0.793 2.582,0.806 2.592,0.819 2.602,0.831 2.613,0.842 2.624,0.853 2.636,0.863 2.649,0.873 2.662,0.882 2.675,0.89 2.689,0.897 2.703,0.904 2.717,0.91 2.732,0.915 2.747,0.92 2.763,0.923 2.778,0.926 2.794,0.928 2.809,0.93 2.825,0.93 4.6,0.93
  region: -3.05,-3.8 -4.56,-3.8 -4.56,-3.2 -3.91,-3.2 -3.91,-2.8 -4.56,-2.8 -4.56,-2.2 -3.05,-2.2
  region: -3.05,2.2 -4.56,2.2 -4.56,2.8 -3.91,2.8 -3.91,3.2 -4.56,3.2 -4.56,3.8 -3.05,3.8
Bottom Designator:
  lines w0.05: -4.71,-4.75 -4.71,4.75 4.75,4.75 4.75,-4.75 -4.71,-4.75
Bottom 3D Body:
  lines w0.1: -1,0 1,0 ; 0,-1 0,1
Top Courtyard (Mech14):
  lines w0.127: -4,-4 4,-4 4,4 -4,4 -4,-4

## TO-252_L (KVU) [mm] "DPAK, 3-Leads, Body 6.7x6.22mm, Pitch 2.29mm, IPC High Density"
height 2.39
pads (3):
  rrect11% 2.5x0.95 smd: 1(-4.15,2.29) 3(-4.15,-2.29)
  rrect2% 6x5.5 smd: 4(2.45,0)
Top Overlay:
  circle w0.25: c-4.064,1.27 r0.125
  lines w0.2: -0.95,-3.35 -2.05,-3.35 -2.05,3.35 -0.95,3.35
Mech Misc 1:
  lines w0.1: -2.05,-3.35 4.17,-3.35 4.17,3.35 -2.05,3.35 -2.05,-3.35
Mech 15:
  lines w0.05: -5.5,-3.45 5.55,-3.45 5.55,3.45 -5.5,3.45 -5.5,-3.45
  lines w0.1: -0.5,0 0.5,0 ; 0,-0.5 0,0.5
3D body "td03b.stp": height 2.48, standoff 0.01, extent -4.631,-3.285 5.068,3.295